# Altium schematic symbol library jlcpcb_2025_04_inductors_extended_0402.schlib: 1396 symbols (part 1 of 8)
Pins are listed as number, name and electrical type; pins without a type are passive.

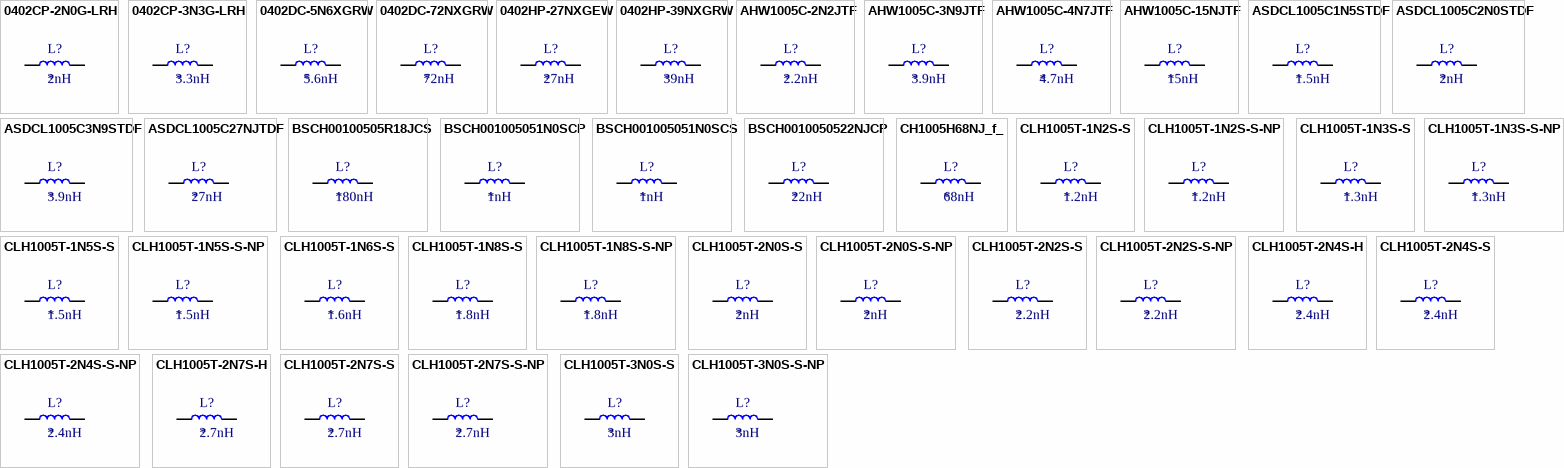
[diagram p0: symbols 0402CP-2N0G-LRH to CLH1005T-3N0S-S-NP]

## 0402CP-2N0G-LRH
designator L?  Inductance: 2nH
Inductor, 2nH, ±2%, 70mΩ, 1.04A, SMD 0402; Manufacturer: PSA(Prosperity Dielectrics); Manufacturer Part Number: 0402CP-2N0G-LRH; Package Size: 0402; JLCPCB Basic Part: No; JLCPCB Part Number: C346262; Supplier 1: LCSC; Category: Inductors; Supplier Part Number 1: C346262; Tolerance: ±2%; Rated Current: 1.04A; DC Resistance: 70mΩ; RoHS: Yes; ComponentLink1Description: Datasheet; ComponentLink1URL: https://wmsc.lcsc.com/wmsc/upload/file/pdf/v2/lcsc/2304140030_PSA-Prosperity-Dielectrics-0402CP-2N0G-LRH_C346262.pdf; ComponentLink2Description: JLCPCB Part URL; ComponentLink2URL: https://jlcpcb.com/partdetail/C346262; ComponentLink3Description: LCSC Part URL; ComponentLink3URL: https://lcsc.com/product-detail/Inductors-SMD_PSAProsperity-Dielectrics-PSAProsperity-Dielectrics-0402CP-2N0G-LRH_C346262.html
footprint IND-0402 (0402 (1005M) Inductor)
pins: 1, 2

## 0402CP-3N3G-LRH
designator L?  Inductance: 3.3nH
Inductor, 3.3nH, ±2%, 66mΩ, 840mA, SMD 0402; Manufacturer: PSA(Prosperity Dielectrics); Manufacturer Part Number: 0402CP-3N3G-LRH; Package Size: 0402; JLCPCB Basic Part: No; JLCPCB Part Number: C346270; Supplier 1: LCSC; Category: Inductors; Supplier Part Number 1: C346270; Tolerance: ±2%; Rated Current: 840mA; DC Resistance: 66mΩ; RoHS: Yes; ComponentLink1Description: Datasheet; ComponentLink1URL: https://wmsc.lcsc.com/wmsc/upload/file/pdf/v2/lcsc/1912111437_PSA-Prosperity-Dielectrics-0402CP-3N3G-LRH_C346270.pdf; ComponentLink2Description: JLCPCB Part URL; ComponentLink2URL: https://jlcpcb.com/partdetail/C346270; ComponentLink3Description: LCSC Part URL; ComponentLink3URL: https://lcsc.com/product-detail/Inductors-SMD_PSAProsperity-Dielectrics-PSAProsperity-Dielectrics-0402CP-3N3G-LRH_C346270.html
footprint IND-0402 (0402 (1005M) Inductor)
pins: 1, 2

## 0402DC-5N6XGRW
designator L?  Inductance: 5.6nH
Inductor, 5.6nH, ±2%, 57mΩ, 1.5A, SMD 0402; Manufacturer: Coilcraft; Manufacturer Part Number: 0402DC-5N6XGRW; Self-Resonant Frequency: 11GHz; Q Factor: 69@900MHz; Package Size: 0402; JLCPCB Basic Part: No; JLCPCB Part Number: C335632; Supplier 1: LCSC; Category: Inductors; Supplier Part Number 1: C335632; Tolerance: ±2%; Rated Current: 1.5A; DC Resistance: 57mΩ; RoHS: Yes; ComponentLink1Description: Datasheet; ComponentLink1URL: https://wmsc.lcsc.com/wmsc/upload/file/pdf/v2/lcsc/2304140030_Coilcraft-0402DC-5N6XGRW_C335632.pdf; ComponentLink2Description: JLCPCB Part URL; ComponentLink2URL: https://jlcpcb.com/partdetail/C335632; ComponentLink3Description: LCSC Part URL; ComponentLink3URL: https://lcsc.com/product-detail/Inductors-SMD_Coilcraft-Coilcraft-0402DC-5N6XGRW_C335632.html
footprint IND-0402 (0402 (1005M) Inductor)
pins: 1, 2

## 0402DC-72NXGRW
designator L?  Inductance: 72nH
Inductor, 72nH, ±2%, 787mΩ, 440mA, SMD 0402; Manufacturer: Coilcraft; Manufacturer Part Number: 0402DC-72NXGRW; Self-Resonant Frequency: 2.83GHz; Q Factor: 54@900MHz; Package Size: 0402; JLCPCB Basic Part: No; JLCPCB Part Number: C335567; Supplier 1: LCSC; Category: Inductors; Supplier Part Number 1: C335567; Tolerance: ±2%; Rated Current: 440mA; DC Resistance: 787mΩ; RoHS: Yes; ComponentLink1Description: Datasheet; ComponentLink1URL: https://wmsc.lcsc.com/wmsc/upload/file/pdf/v2/lcsc/2304140030_Coilcraft-0402DC-72NXGRW_C335567.pdf; ComponentLink2Description: JLCPCB Part URL; ComponentLink2URL: https://jlcpcb.com/partdetail/C335567; ComponentLink3Description: LCSC Part URL; ComponentLink3URL: https://lcsc.com/product-detail/Inductors-SMD_Coilcraft-Coilcraft-0402DC-72NXGRW_C335567.html
footprint IND-0402 (0402 (1005M) Inductor)
pins: 1, 2

## 0402HP-27NXGEW
designator L?  Inductance: 27nH
Inductor, 27nH, ±2%, 350mΩ, 450mA, SMD 0402; Manufacturer: Coilcraft; Manufacturer Part Number: 0402HP-27NXGEW; Self-Resonant Frequency: 3.2GHz; Q Factor: 62@900MHz; Package Size: 0402; JLCPCB Basic Part: No; JLCPCB Part Number: C335556; Supplier 1: LCSC; Category: Inductors; Supplier Part Number 1: C335556; Tolerance: ±2%; Rated Current: 450mA; DC Resistance: 350mΩ; RoHS: Yes; ComponentLink1Description: Datasheet; ComponentLink1URL: https://wmsc.lcsc.com/wmsc/upload/file/pdf/v2/lcsc/1912111437_Coilcraft-0402HP-27NXGEW_C335556.pdf; ComponentLink2Description: JLCPCB Part URL; ComponentLink2URL: https://jlcpcb.com/partdetail/C335556; ComponentLink3Description: LCSC Part URL; ComponentLink3URL: https://lcsc.com/product-detail/Inductors-SMD_Coilcraft-Coilcraft-0402HP-27NXGEW_C335556.html
footprint IND-0402 (0402 (1005M) Inductor)
pins: 1, 2

## 0402HP-39NXGRW
designator L?  Inductance: 39nH
Inductor, 39nH, SMD 0402; Manufacturer: Coilcraft; Manufacturer Part Number: 0402HP-39NXGRW; Package Size: 0402; JLCPCB Basic Part: No; JLCPCB Part Number: C335561; Supplier 1: LCSC; Category: Inductors; Supplier Part Number 1: C335561; RoHS: Yes; ComponentLink1Description: Datasheet; ComponentLink2Description: JLCPCB Part URL; ComponentLink2URL: https://jlcpcb.com/partdetail/C335561; ComponentLink3Description: LCSC Part URL; ComponentLink3URL: https://lcsc.com/product-detail/Inductors-SMD_Coilcraft-Coilcraft-0402HP-39NXGRW_C335561.html
footprint IND-0402 (0402 (1005M) Inductor)
pins: 1, 2

## AHW1005C-2N2JTF
designator L?  Inductance: 2.2nH
Inductor, 2.2nH, ±5%, 90mΩ, 960mA, SMD 0402; Manufacturer: APV; Manufacturer Part Number: AHW1005C-2N2JTF; Self-Resonant Frequency: 10.8GHz; Q Factor: 21; Package Size: 0402; JLCPCB Basic Part: No; JLCPCB Part Number: C7497025; Supplier 1: LCSC; Category: Inductors; Supplier Part Number 1: C7497025; Tolerance: ±5%; Rated Current: 960mA; DC Resistance: 90mΩ; RoHS: Yes; ComponentLink1Description: Datasheet; ComponentLink1URL: https://wmsc.lcsc.com/wmsc/upload/file/pdf/v2/lcsc/2308011557_APV-AHW1005C-2N2JTF_C7497025.pdf; ComponentLink2Description: JLCPCB Part URL; ComponentLink2URL: https://jlcpcb.com/partdetail/C7497025; ComponentLink3Description: LCSC Part URL; ComponentLink3URL: https://lcsc.com/product-detail/Inductors-SMD_APV-APV-AHW1005C-2N2JTF_C7497025.html
footprint IND-0402 (0402 (1005M) Inductor)
pins: 1, 2

## AHW1005C-3N9JTF
designator L?  Inductance: 3.9nH
Inductor, 3.9nH, ±5%, 76mΩ, 840mA, SMD 0402; Manufacturer: APV; Manufacturer Part Number: AHW1005C-3N9JTF; Self-Resonant Frequency: 6GHz; Q Factor: 24; Package Size: 0402; JLCPCB Basic Part: No; JLCPCB Part Number: C6807988; Supplier 1: LCSC; Category: Inductors; Supplier Part Number 1: C6807988; Tolerance: ±5%; Rated Current: 840mA; DC Resistance: 76mΩ; RoHS: Yes; ComponentLink1Description: Datasheet; ComponentLink1URL: https://wmsc.lcsc.com/wmsc/upload/file/pdf/v2/lcsc/2306211548_APV-AHW1005C-3N9JTF_C6807988.pdf; ComponentLink2Description: JLCPCB Part URL; ComponentLink2URL: https://jlcpcb.com/partdetail/C6807988; ComponentLink3Description: LCSC Part URL; ComponentLink3URL: https://lcsc.com/product-detail/Inductors-SMD_APV-APV-AHW1005C-3N9JTF_C6807988.html
footprint IND-0402 (0402 (1005M) Inductor)
pins: 1, 2

## AHW1005C-4N7JTF
designator L?  Inductance: 4.7nH
Inductor, 4.7nH, ±5%, 130mΩ, 640mA, SMD 0402; Manufacturer: APV; Manufacturer Part Number: AHW1005C-4N7JTF; Self-Resonant Frequency: 4.77GHz; Q Factor: 20; Package Size: 0402; JLCPCB Basic Part: No; JLCPCB Part Number: C7427063; Supplier 1: LCSC; Category: Inductors; Supplier Part Number 1: C7427063; Tolerance: ±5%; Rated Current: 640mA; DC Resistance: 130mΩ; RoHS: Yes; ComponentLink1Description: Datasheet; ComponentLink1URL: https://wmsc.lcsc.com/wmsc/upload/file/pdf/v2/lcsc/2306141056_APV-AHW1005C-4N7JTF_C7427063.pdf; ComponentLink2Description: JLCPCB Part URL; ComponentLink2URL: https://jlcpcb.com/partdetail/C7427063; ComponentLink3Description: LCSC Part URL; ComponentLink3URL: https://lcsc.com/product-detail/Inductors-SMD_APV-APV-AHW1005C-4N7JTF_C7427063.html
footprint IND-0402 (0402 (1005M) Inductor)
pins: 1, 2

## AHW1005C-15NJTF
designator L?  Inductance: 15nH
Inductor, 15nH, ±5%, 170mΩ, 560mA, SMD 0402; Manufacturer: APV; Manufacturer Part Number: AHW1005C-15NJTF; Self-Resonant Frequency: 3.28GHz; Q Factor: 26; Package Size: 0402; JLCPCB Basic Part: No; JLCPCB Part Number: C6364689; Supplier 1: LCSC; Category: Inductors; Supplier Part Number 1: C6364689; Tolerance: ±5%; Rated Current: 560mA; DC Resistance: 170mΩ; RoHS: Yes; ComponentLink1Description: Datasheet; ComponentLink1URL: https://wmsc.lcsc.com/wmsc/upload/file/pdf/v2/lcsc/2305231104_APV-AHW1005C-15NJTF_C6364689.pdf; ComponentLink2Description: JLCPCB Part URL; ComponentLink2URL: https://jlcpcb.com/partdetail/C6364689; ComponentLink3Description: LCSC Part URL; ComponentLink3URL: https://lcsc.com/product-detail/Inductors-SMD_APV-APV-AHW1005C-15NJTF_C6364689.html
footprint IND-0402 (0402 (1005M) Inductor)
pins: 1, 2

## ASDCL1005C1N5STDF
designator L?  Inductance: 1.5nH
Inductor, 1.5nH, 100mΩ, 300mA, SMD 0402; Manufacturer: Sunlord; Manufacturer Part Number: ASDCL1005C1N5STDF; Self-Resonant Frequency: 6GHz; Package Size: 0402; JLCPCB Basic Part: No; JLCPCB Part Number: C2846441; Supplier 1: LCSC; Category: Inductors; Supplier Part Number 1: C2846441; Rated Current: 300mA; DC Resistance: 100mΩ; RoHS: Yes; ComponentLink1Description: Datasheet; ComponentLink1URL: https://wmsc.lcsc.com/wmsc/upload/file/pdf/v2/lcsc/2310301640_Sunlord-ASDCL1005C1N5STDF_C2846441.pdf; ComponentLink2Description: JLCPCB Part URL; ComponentLink2URL: https://jlcpcb.com/partdetail/C2846441; ComponentLink3Description: LCSC Part URL; ComponentLink3URL: https://lcsc.com/product-detail/Inductors-SMD_Sunlord-Sunlord-ASDCL1005C1N5STDF_C2846441.html
footprint IND-0402 (0402 (1005M) Inductor)
pins: 1, 2

## ASDCL1005C2N0STDF
designator L?  Inductance: 2nH
Inductor, 2nH, 300mA, SMD 0402; Manufacturer: Sunlord; Manufacturer Part Number: ASDCL1005C2N0STDF; Package Size: 0402; JLCPCB Basic Part: No; JLCPCB Part Number: C2846444; Supplier 1: LCSC; Category: Inductors; Supplier Part Number 1: C2846444; Rated Current: 300mA; RoHS: Yes; ComponentLink1Description: Datasheet; ComponentLink1URL: https://wmsc.lcsc.com/wmsc/upload/file/pdf/v2/lcsc/2310301640_Sunlord-ASDCL1005C2N0STDF_C2846444.pdf; ComponentLink2Description: JLCPCB Part URL; ComponentLink2URL: https://jlcpcb.com/partdetail/C2846444; ComponentLink3Description: LCSC Part URL; ComponentLink3URL: https://lcsc.com/product-detail/Inductors-SMD_Sunlord-Sunlord-ASDCL1005C2N0STDF_C2846444.html
footprint IND-0402 (0402 (1005M) Inductor)
pins: 1, 2

## ASDCL1005C3N9STDF
designator L?  Inductance: 3.9nH
Inductor, 3.9nH, 200mΩ, 300mA, SMD 0402; Manufacturer: Sunlord; Manufacturer Part Number: ASDCL1005C3N9STDF; Self-Resonant Frequency: 4GHz; Q Factor: 8@100MHz; Package Size: 0402; JLCPCB Basic Part: No; JLCPCB Part Number: C2846451; Supplier 1: LCSC; Category: Inductors; Supplier Part Number 1: C2846451; Rated Current: 300mA; DC Resistance: 200mΩ; RoHS: Yes; ComponentLink1Description: Datasheet; ComponentLink1URL: https://wmsc.lcsc.com/wmsc/upload/file/pdf/v2/lcsc/2310301640_Sunlord-ASDCL1005C3N9STDF_C2846451.pdf; ComponentLink2Description: JLCPCB Part URL; ComponentLink2URL: https://jlcpcb.com/partdetail/C2846451; ComponentLink3Description: LCSC Part URL; ComponentLink3URL: https://lcsc.com/product-detail/Inductors-SMD_Sunlord-Sunlord-ASDCL1005C3N9STDF_C2846451.html
footprint IND-0402 (0402 (1005M) Inductor)
pins: 1, 2

## ASDCL1005C27NJTDF
designator L?  Inductance: 27nH
Inductor, 27nH, ±5%, 0.7Ω, 300mA, SMD 0402; Manufacturer: Sunlord; Manufacturer Part Number: ASDCL1005C27NJTDF; Self-Resonant Frequency: 1.6GHz; Q Factor: 8@100MHz; Package Size: 0402; JLCPCB Basic Part: No; JLCPCB Part Number: C2846467; Supplier 1: LCSC; Category: Inductors; Supplier Part Number 1: C2846467; Tolerance: ±5%; Rated Current: 300mA; DC Resistance: 0.7Ω; RoHS: Yes; ComponentLink1Description: Datasheet; ComponentLink1URL: https://wmsc.lcsc.com/wmsc/upload/file/pdf/v2/lcsc/2310301640_Sunlord-ASDCL1005C27NJTDF_C2846467.pdf; ComponentLink2Description: JLCPCB Part URL; ComponentLink2URL: https://jlcpcb.com/partdetail/C2846467; ComponentLink3Description: LCSC Part URL; ComponentLink3URL: https://lcsc.com/product-detail/Inductors-SMD_Sunlord-Sunlord-ASDCL1005C27NJTDF_C2846467.html
footprint IND-0402 (0402 (1005M) Inductor)
pins: 1, 2

## BSCH00100505R18JCS
designator L?  Inductance: 180nH
Inductor, 180nH, ±5%, SMD 0402; Manufacturer: Chilisin Elec; Manufacturer Part Number: BSCH00100505R18JCS; Package Size: 0402; JLCPCB Basic Part: No; JLCPCB Part Number: C2981210; Supplier 1: LCSC; Category: Inductors; Supplier Part Number 1: C2981210; Tolerance: ±5%; RoHS: Yes; ComponentLink1Description: Datasheet; ComponentLink1URL: https://wmsc.lcsc.com/wmsc/upload/file/pdf/v2/lcsc/2204251600_Chilisin-Elec-BSCH00100505R18JCS_C2981210.pdf; ComponentLink2Description: JLCPCB Part URL; ComponentLink2URL: https://jlcpcb.com/partdetail/C2981210; ComponentLink3Description: LCSC Part URL; ComponentLink3URL: https://lcsc.com/product-detail/Power-Inductors_Chilisin-Elec-Chilisin-Elec-BSCH00100505R18JCS_C2981210.html
footprint IND-0402 (0402 (1005M) Inductor)
pins: 1, 2

## BSCH001005051N0SCP
designator L?  Inductance: 1nH
Inductor, 1nH, 70mΩ, 400mA, SMD 0402; Manufacturer: Chilisin Elec; Manufacturer Part Number: BSCH001005051N0SCP; Package Size: 0402; JLCPCB Basic Part: No; JLCPCB Part Number: C3910754; Supplier 1: LCSC; Category: Inductors; Supplier Part Number 1: C3910754; Rated Current: 400mA; DC Resistance: 70mΩ; RoHS: Yes; ComponentLink1Description: Datasheet; ComponentLink1URL: https://wmsc.lcsc.com/wmsc/upload/file/pdf/v2/lcsc/2404081008_Chilisin-Elec-BSCH001005051N0SCP_C3910754.pdf; ComponentLink2Description: JLCPCB Part URL; ComponentLink2URL: https://jlcpcb.com/partdetail/C3910754; ComponentLink3Description: LCSC Part URL; ComponentLink3URL: https://lcsc.com/product-detail/Power-Inductors_Chilisin-Elec-Chilisin-Elec-BSCH001005051N0SCP_C3910754.html
footprint IND-0402 (0402 (1005M) Inductor)
pins: 1, 2

## BSCH001005051N0SCS
designator L?  Inductance: 1nH
Inductor, 1nH, 70mΩ, 400mA, SMD 0402; Manufacturer: Chilisin Elec; Manufacturer Part Number: BSCH001005051N0SCS; Q Factor: 8@100MHz; Package Size: 0402; JLCPCB Basic Part: No; JLCPCB Part Number: C2935072; Supplier 1: LCSC; Category: Inductors; Supplier Part Number 1: C2935072; Rated Current: 400mA; DC Resistance: 70mΩ; RoHS: Yes; ComponentLink1Description: Datasheet; ComponentLink1URL: https://wmsc.lcsc.com/wmsc/upload/file/pdf/v2/lcsc/2201121700_Chilisin-Elec-BSCH001005051N0SCS_C2935072.pdf; ComponentLink2Description: JLCPCB Part URL; ComponentLink2URL: https://jlcpcb.com/partdetail/C2935072; ComponentLink3Description: LCSC Part URL; ComponentLink3URL: https://lcsc.com/product-detail/Inductors-SMD_Chilisin-Elec-Chilisin-Elec-BSCH001005051N0SCS_C2935072.html
footprint IND-0402 (0402 (1005M) Inductor)
pins: 1, 2

## BSCH0010050522NJCP
designator L?  Inductance: 22nH
Inductor, 22nH, ±5%, SMD 0402; Manufacturer: Chilisin Elec; Manufacturer Part Number: BSCH0010050522NJCP; Package Size: 0402; JLCPCB Basic Part: No; JLCPCB Part Number: C2935073; Supplier 1: LCSC; Category: Inductors; Supplier Part Number 1: C2935073; Tolerance: ±5%; RoHS: Yes; ComponentLink1Description: Datasheet; ComponentLink1URL: https://wmsc.lcsc.com/wmsc/upload/file/pdf/v2/lcsc/2204151745_Chilisin-Elec-BSCH0010050522NJCP_C2935073.pdf; ComponentLink2Description: JLCPCB Part URL; ComponentLink2URL: https://jlcpcb.com/partdetail/C2935073; ComponentLink3Description: LCSC Part URL; ComponentLink3URL: https://lcsc.com/product-detail/Power-Inductors_Chilisin-Elec-Chilisin-Elec-BSCH0010050522NJCP_C2935073.html
footprint IND-0402 (0402 (1005M) Inductor)
pins: 1, 2

## CH1005H68NJ_f_
designator L?  Inductance: 68nH
Inductor, 68nH, ±5%, 2.1Ω, 150mA, SMD 0402; Manufacturer: CEC(Shenzhen Zhenhua Fu Elec); Manufacturer Part Number: CH1005H68NJ(f); Self-Resonant Frequency: 800MHz; Q Factor: 8@100MHz; Package Size: 0402; JLCPCB Basic Part: No; JLCPCB Part Number: C316325; Supplier 1: LCSC; Category: Inductors; Supplier Part Number 1: C316325; Tolerance: ±5%; Rated Current: 150mA; DC Resistance: 2.1Ω; RoHS: Yes; ComponentLink1Description: Datasheet; ComponentLink1URL: https://wmsc.lcsc.com/wmsc/upload/file/pdf/v2/lcsc/2304140030_CEC-Shenzhen-Zhenhua-Fu-Elec-CH1005H68NJ-f_C316325.pdf; ComponentLink2Description: JLCPCB Part URL; ComponentLink2URL: https://jlcpcb.com/partdetail/C316325; ComponentLink3Description: LCSC Part URL; ComponentLink3URL: https://lcsc.com/product-detail/Inductors-SMD_CECShenzhen-Zhenhua-Fu-Elec-CECShenzhen-Zhenhua-Fu-Elec-CH1005H68NJf_C316325.html
footprint IND-0402 (0402 (1005M) Inductor)
pins: 1, 2

## CLH1005T-1N2S-S
designator L?  Inductance: 1.2nH
Inductor, 1.2nH, 90mΩ, 400mA, SMD 0402; Manufacturer: Chilisin Elec; Manufacturer Part Number: CLH1005T-1N2S-S; Self-Resonant Frequency: 10GHz; Q Factor: 8@100MHz; Package Size: 0402; JLCPCB Basic Part: No; JLCPCB Part Number: C108251; Supplier 1: LCSC; Category: Inductors; Supplier Part Number 1: C108251; Rated Current: 400mA; DC Resistance: 90mΩ; RoHS: Yes; ComponentLink1Description: Datasheet; ComponentLink1URL: https://wmsc.lcsc.com/wmsc/upload/file/pdf/v2/lcsc/2304140030_Chilisin-Elec-CLH1005T-1N2S-S_C108251.pdf; ComponentLink2Description: JLCPCB Part URL; ComponentLink2URL: https://jlcpcb.com/partdetail/C108251; ComponentLink3Description: LCSC Part URL; ComponentLink3URL: https://lcsc.com/product-detail/Inductors-SMD_Chilisin-Elec-Chilisin-Elec-CLH1005T-1N2S-S_C108251.html
footprint IND-0402 (0402 (1005M) Inductor)
pins: 1, 2

## CLH1005T-1N2S-S-NP
designator L?  Inductance: 1.2nH
Inductor, 1.2nH, 90mΩ, 400mA, SMD 0402; Manufacturer: Chilisin Elec; Manufacturer Part Number: CLH1005T-1N2S-S-NP; Self-Resonant Frequency: 10GHz; Q Factor: 8@100MHz; Package Size: 0402; JLCPCB Basic Part: No; JLCPCB Part Number: C142247; Supplier 1: LCSC; Category: Inductors; Supplier Part Number 1: C142247; Rated Current: 400mA; DC Resistance: 90mΩ; RoHS: Yes; ComponentLink1Description: Datasheet; ComponentLink1URL: https://wmsc.lcsc.com/wmsc/upload/file/pdf/v2/lcsc/2304140030_Chilisin-Elec-CLH1005T-1N2S-S-NP_C142247.pdf; ComponentLink2Description: JLCPCB Part URL; ComponentLink2URL: https://jlcpcb.com/partdetail/C142247; ComponentLink3Description: LCSC Part URL; ComponentLink3URL: https://lcsc.com/product-detail/Inductors-SMD_Chilisin-Elec-Chilisin-Elec-CLH1005T-1N2S-S-NP_C142247.html
footprint IND-0402 (0402 (1005M) Inductor)
pins: 1, 2

## CLH1005T-1N3S-S
designator L?  Inductance: 1.3nH
Inductor, 1.3nH, 100mΩ, 400mA, SMD 0402; Manufacturer: Chilisin Elec; Manufacturer Part Number: CLH1005T-1N3S-S; Self-Resonant Frequency: 9GHz; Q Factor: 8@100MHz; Package Size: 0402; JLCPCB Basic Part: No; JLCPCB Part Number: C365894; Supplier 1: LCSC; Category: Inductors; Supplier Part Number 1: C365894; Rated Current: 400mA; DC Resistance: 100mΩ; RoHS: Yes; ComponentLink1Description: Datasheet; ComponentLink1URL: https://wmsc.lcsc.com/wmsc/upload/file/pdf/v2/lcsc/2304140030_Chilisin-Elec-CLH1005T-1N3S-S_C365894.pdf; ComponentLink2Description: JLCPCB Part URL; ComponentLink2URL: https://jlcpcb.com/partdetail/C365894; ComponentLink3Description: LCSC Part URL; ComponentLink3URL: https://lcsc.com/product-detail/Inductors-SMD_Chilisin-Elec-Chilisin-Elec-CLH1005T-1N3S-S_C365894.html
footprint IND-0402 (0402 (1005M) Inductor)
pins: 1, 2

## CLH1005T-1N3S-S-NP
designator L?  Inductance: 1.3nH
Inductor, 1.3nH, 100mΩ, 400mA, SMD 0402; Manufacturer: Chilisin Elec; Manufacturer Part Number: CLH1005T-1N3S-S-NP; Self-Resonant Frequency: 6GHz; Q Factor: 8@100MHz; Package Size: 0402; JLCPCB Basic Part: No; JLCPCB Part Number: C280670; Supplier 1: LCSC; Category: Inductors; Supplier Part Number 1: C280670; Rated Current: 400mA; DC Resistance: 100mΩ; RoHS: Yes; ComponentLink1Description: Datasheet; ComponentLink1URL: https://wmsc.lcsc.com/wmsc/upload/file/pdf/v2/lcsc/2304140030_Chilisin-Elec-CLH1005T-1N3S-S-NP_C280670.pdf; ComponentLink2Description: JLCPCB Part URL; ComponentLink2URL: https://jlcpcb.com/partdetail/C280670; ComponentLink3Description: LCSC Part URL; ComponentLink3URL: https://lcsc.com/product-detail/Inductors-SMD_Chilisin-Elec-Chilisin-Elec-CLH1005T-1N3S-S-NP_C280670.html
footprint IND-0402 (0402 (1005M) Inductor)
pins: 1, 2

## CLH1005T-1N5S-S
designator L?  Inductance: 1.5nH
Inductor, 1.5nH, 100mΩ, 400mA, SMD 0402; Manufacturer: Chilisin Elec; Manufacturer Part Number: CLH1005T-1N5S-S; Self-Resonant Frequency: 9GHz; Q Factor: 8@100MHz; Package Size: 0402; JLCPCB Basic Part: No; JLCPCB Part Number: C108252; Supplier 1: LCSC; Category: Inductors; Supplier Part Number 1: C108252; Rated Current: 400mA; DC Resistance: 100mΩ; RoHS: Yes; ComponentLink1Description: Datasheet; ComponentLink1URL: https://wmsc.lcsc.com/wmsc/upload/file/pdf/v2/lcsc/2304140030_Chilisin-Elec-CLH1005T-1N5S-S_C108252.pdf; ComponentLink2Description: JLCPCB Part URL; ComponentLink2URL: https://jlcpcb.com/partdetail/C108252; ComponentLink3Description: LCSC Part URL; ComponentLink3URL: https://lcsc.com/product-detail/Inductors-SMD_Chilisin-Elec-Chilisin-Elec-CLH1005T-1N5S-S_C108252.html
footprint IND-0402 (0402 (1005M) Inductor)
pins: 1, 2

## CLH1005T-1N5S-S-NP
designator L?  Inductance: 1.5nH
Inductor, 1.5nH, 100mΩ, 400mA, SMD 0402; Manufacturer: Chilisin Elec; Manufacturer Part Number: CLH1005T-1N5S-S-NP; Self-Resonant Frequency: 9GHz; Q Factor: 8@100MHz; Package Size: 0402; JLCPCB Basic Part: No; JLCPCB Part Number: C142246; Supplier 1: LCSC; Category: Inductors; Supplier Part Number 1: C142246; Rated Current: 400mA; DC Resistance: 100mΩ; RoHS: Yes; ComponentLink1Description: Datasheet; ComponentLink1URL: https://wmsc.lcsc.com/wmsc/upload/file/pdf/v2/lcsc/2304140030_Chilisin-Elec-CLH1005T-1N5S-S-NP_C142246.pdf; ComponentLink2Description: JLCPCB Part URL; ComponentLink2URL: https://jlcpcb.com/partdetail/C142246; ComponentLink3Description: LCSC Part URL; ComponentLink3URL: https://lcsc.com/product-detail/Inductors-SMD_Chilisin-Elec-Chilisin-Elec-CLH1005T-1N5S-S-NP_C142246.html
footprint IND-0402 (0402 (1005M) Inductor)
pins: 1, 2

## CLH1005T-1N6S-S
designator L?  Inductance: 1.6nH
Inductor, 1.6nH, 100mΩ, 400mA, SMD 0402; Manufacturer: Chilisin Elec; Manufacturer Part Number: CLH1005T-1N6S-S; Self-Resonant Frequency: 8.7GHz; Q Factor: 8@100MHz; Package Size: 0402; JLCPCB Basic Part: No; JLCPCB Part Number: C365895; Supplier 1: LCSC; Category: Inductors; Supplier Part Number 1: C365895; Rated Current: 400mA; DC Resistance: 100mΩ; RoHS: Yes; ComponentLink1Description: Datasheet; ComponentLink1URL: https://wmsc.lcsc.com/wmsc/upload/file/pdf/v2/lcsc/2304140030_Chilisin-Elec-CLH1005T-1N6S-S_C365895.pdf; ComponentLink2Description: JLCPCB Part URL; ComponentLink2URL: https://jlcpcb.com/partdetail/C365895; ComponentLink3Description: LCSC Part URL; ComponentLink3URL: https://lcsc.com/product-detail/Inductors-SMD_Chilisin-Elec-Chilisin-Elec-CLH1005T-1N6S-S_C365895.html
footprint IND-0402 (0402 (1005M) Inductor)
pins: 1, 2

## CLH1005T-1N8S-S
designator L?  Inductance: 1.8nH
Inductor, 1.8nH, 100mΩ, 400mA, SMD 0402; Manufacturer: Chilisin Elec; Manufacturer Part Number: CLH1005T-1N8S-S; Self-Resonant Frequency: 8.7GHz; Q Factor: 8@100MHz; Package Size: 0402; JLCPCB Basic Part: No; JLCPCB Part Number: C142245; Supplier 1: LCSC; Category: Inductors; Supplier Part Number 1: C142245; Rated Current: 400mA; DC Resistance: 100mΩ; RoHS: Yes; ComponentLink1Description: Datasheet; ComponentLink1URL: https://wmsc.lcsc.com/wmsc/upload/file/pdf/v2/lcsc/2304140030_Chilisin-Elec-CLH1005T-1N8S-S_C142245.pdf; ComponentLink2Description: JLCPCB Part URL; ComponentLink2URL: https://jlcpcb.com/partdetail/C142245; ComponentLink3Description: LCSC Part URL; ComponentLink3URL: https://lcsc.com/product-detail/Inductors-SMD_Chilisin-Elec-Chilisin-Elec-CLH1005T-1N8S-S_C142245.html
footprint IND-0402 (0402 (1005M) Inductor)
pins: 1, 2

## CLH1005T-1N8S-S-NP
designator L?  Inductance: 1.8nH
Inductor, 1.8nH, 100mΩ, 400mA, SMD 0402; Manufacturer: Chilisin Elec; Manufacturer Part Number: CLH1005T-1N8S-S-NP; Self-Resonant Frequency: 8.7GHz; Q Factor: 8@100MHz; Package Size: 0402; JLCPCB Basic Part: No; JLCPCB Part Number: C142244; Supplier 1: LCSC; Category: Inductors; Supplier Part Number 1: C142244; Rated Current: 400mA; DC Resistance: 100mΩ; RoHS: Yes; ComponentLink1Description: Datasheet; ComponentLink1URL: https://wmsc.lcsc.com/wmsc/upload/file/pdf/v2/lcsc/2304140030_Chilisin-Elec-CLH1005T-1N8S-S-NP_C142244.pdf; ComponentLink2Description: JLCPCB Part URL; ComponentLink2URL: https://jlcpcb.com/partdetail/C142244; ComponentLink3Description: LCSC Part URL; ComponentLink3URL: https://lcsc.com/product-detail/Inductors-SMD_Chilisin-Elec-Chilisin-Elec-CLH1005T-1N8S-S-NP_C142244.html
footprint IND-0402 (0402 (1005M) Inductor)
pins: 1, 2

## CLH1005T-2N0S-S
designator L?  Inductance: 2nH
Inductor, 2nH, 100mΩ, 400mA, SMD 0402; Manufacturer: Chilisin Elec; Manufacturer Part Number: CLH1005T-2N0S-S; Self-Resonant Frequency: 8.1GHz; Q Factor: 8@100MHz; Package Size: 0402; JLCPCB Basic Part: No; JLCPCB Part Number: C142240; Supplier 1: LCSC; Category: Inductors; Supplier Part Number 1: C142240; Rated Current: 400mA; DC Resistance: 100mΩ; RoHS: Yes; ComponentLink1Description: Datasheet; ComponentLink1URL: https://wmsc.lcsc.com/wmsc/upload/file/pdf/v2/lcsc/2304140030_Chilisin-Elec-CLH1005T-2N0S-S_C142240.pdf; ComponentLink2Description: JLCPCB Part URL; ComponentLink2URL: https://jlcpcb.com/partdetail/C142240; ComponentLink3Description: LCSC Part URL; ComponentLink3URL: https://lcsc.com/product-detail/Inductors-SMD_Chilisin-Elec-Chilisin-Elec-CLH1005T-2N0S-S_C142240.html
footprint IND-0402 (0402 (1005M) Inductor)
pins: 1, 2

## CLH1005T-2N0S-S-NP
designator L?  Inductance: 2nH
Inductor, 2nH, 100mΩ, 400mA, SMD 0402; Manufacturer: Chilisin Elec; Manufacturer Part Number: CLH1005T-2N0S-S-NP; Self-Resonant Frequency: 8.1GHz; Q Factor: 8@100MHz; Package Size: 0402; JLCPCB Basic Part: No; JLCPCB Part Number: C142239; Supplier 1: LCSC; Category: Inductors; Supplier Part Number 1: C142239; Rated Current: 400mA; DC Resistance: 100mΩ; RoHS: Yes; ComponentLink1Description: Datasheet; ComponentLink1URL: https://wmsc.lcsc.com/wmsc/upload/file/pdf/v2/lcsc/2304140030_Chilisin-Elec-CLH1005T-2N0S-S-NP_C142239.pdf; ComponentLink2Description: JLCPCB Part URL; ComponentLink2URL: https://jlcpcb.com/partdetail/C142239; ComponentLink3Description: LCSC Part URL; ComponentLink3URL: https://lcsc.com/product-detail/Inductors-SMD_Chilisin-Elec-Chilisin-Elec-CLH1005T-2N0S-S-NP_C142239.html
footprint IND-0402 (0402 (1005M) Inductor)
pins: 1, 2

## CLH1005T-2N2S-S
designator L?  Inductance: 2.2nH
Inductor, 2.2nH, 120mΩ, 400mA, SMD 0402; Manufacturer: Chilisin Elec; Manufacturer Part Number: CLH1005T-2N2S-S; Self-Resonant Frequency: 8.1GHz; Q Factor: 8@100MHz; Package Size: 0402; JLCPCB Basic Part: No; JLCPCB Part Number: C108254; Supplier 1: LCSC; Category: Inductors; Supplier Part Number 1: C108254; Rated Current: 400mA; DC Resistance: 120mΩ; RoHS: Yes; ComponentLink1Description: Datasheet; ComponentLink1URL: https://wmsc.lcsc.com/wmsc/upload/file/pdf/v2/lcsc/2304140030_Chilisin-Elec-CLH1005T-2N2S-S_C108254.pdf; ComponentLink2Description: JLCPCB Part URL; ComponentLink2URL: https://jlcpcb.com/partdetail/C108254; ComponentLink3Description: LCSC Part URL; ComponentLink3URL: https://lcsc.com/product-detail/Inductors-SMD_Chilisin-Elec-Chilisin-Elec-CLH1005T-2N2S-S_C108254.html
footprint IND-0402 (0402 (1005M) Inductor)
pins: 1, 2

## CLH1005T-2N2S-S-NP
designator L?  Inductance: 2.2nH
Inductor, 2.2nH, 120mΩ, 400mA, SMD 0402; Manufacturer: Chilisin Elec; Manufacturer Part Number: CLH1005T-2N2S-S-NP; Self-Resonant Frequency: 8.1GHz; Q Factor: 8@100MHz; Package Size: 0402; JLCPCB Basic Part: No; JLCPCB Part Number: C142238; Supplier 1: LCSC; Category: Inductors; Supplier Part Number 1: C142238; Rated Current: 400mA; DC Resistance: 120mΩ; RoHS: Yes; ComponentLink1Description: Datasheet; ComponentLink1URL: https://wmsc.lcsc.com/wmsc/upload/file/pdf/v2/lcsc/2304140030_Chilisin-Elec-CLH1005T-2N2S-S-NP_C142238.pdf; ComponentLink2Description: JLCPCB Part URL; ComponentLink2URL: https://jlcpcb.com/partdetail/C142238; ComponentLink3Description: LCSC Part URL; ComponentLink3URL: https://lcsc.com/product-detail/Inductors-SMD_Chilisin-Elec-Chilisin-Elec-CLH1005T-2N2S-S-NP_C142238.html
footprint IND-0402 (0402 (1005M) Inductor)
pins: 1, 2

## CLH1005T-2N4S-H
designator L?  Inductance: 2.4nH
Inductor, 2.4nH, SMD 0402; Manufacturer: Chilisin Elec; Manufacturer Part Number: CLH1005T-2N4S-H; Package Size: 0402; JLCPCB Basic Part: No; JLCPCB Part Number: C329630; Supplier 1: LCSC; Category: Inductors; Supplier Part Number 1: C329630; RoHS: Yes; ComponentLink1Description: Datasheet; ComponentLink1URL: https://wmsc.lcsc.com/wmsc/upload/file/pdf/v2/lcsc/1912111437_Chilisin-Elec-CLH1005T-2N4S-H_C329630.pdf; ComponentLink2Description: JLCPCB Part URL; ComponentLink2URL: https://jlcpcb.com/partdetail/C329630; ComponentLink3Description: LCSC Part URL; ComponentLink3URL: https://lcsc.com/product-detail/Inductors-SMD_Chilisin-Elec-Chilisin-Elec-CLH1005T-2N4S-H_C329630.html
footprint IND-0402 (0402 (1005M) Inductor)
pins: 1, 2

## CLH1005T-2N4S-S
designator L?  Inductance: 2.4nH
Inductor, 2.4nH, 150mΩ, 400mA, SMD 0402; Manufacturer: Chilisin Elec; Manufacturer Part Number: CLH1005T-2N4S-S; Self-Resonant Frequency: 7.7GHz; Q Factor: 8@100MHz; Package Size: 0402; JLCPCB Basic Part: No; JLCPCB Part Number: C142237; Supplier 1: LCSC; Category: Inductors; Supplier Part Number 1: C142237; Rated Current: 400mA; DC Resistance: 150mΩ; RoHS: Yes; ComponentLink1Description: Datasheet; ComponentLink1URL: https://wmsc.lcsc.com/wmsc/upload/file/pdf/v2/lcsc/2304140030_Chilisin-Elec-CLH1005T-2N4S-S_C142237.pdf; ComponentLink2Description: JLCPCB Part URL; ComponentLink2URL: https://jlcpcb.com/partdetail/C142237; ComponentLink3Description: LCSC Part URL; ComponentLink3URL: https://lcsc.com/product-detail/Inductors-SMD_Chilisin-Elec-Chilisin-Elec-CLH1005T-2N4S-S_C142237.html
footprint IND-0402 (0402 (1005M) Inductor)
pins: 1, 2

## CLH1005T-2N4S-S-NP
designator L?  Inductance: 2.4nH
Inductor, 2.4nH, 150mΩ, 400mA, SMD 0402; Manufacturer: Chilisin Elec; Manufacturer Part Number: CLH1005T-2N4S-S-NP; Self-Resonant Frequency: 7.7GHz; Q Factor: 8@100MHz; Package Size: 0402; JLCPCB Basic Part: No; JLCPCB Part Number: C142236; Supplier 1: LCSC; Category: Inductors; Supplier Part Number 1: C142236; Rated Current: 400mA; DC Resistance: 150mΩ; RoHS: Yes; ComponentLink1Description: Datasheet; ComponentLink1URL: https://wmsc.lcsc.com/wmsc/upload/file/pdf/v2/lcsc/2304140030_Chilisin-Elec-CLH1005T-2N4S-S-NP_C142236.pdf; ComponentLink2Description: JLCPCB Part URL; ComponentLink2URL: https://jlcpcb.com/partdetail/C142236; ComponentLink3Description: LCSC Part URL; ComponentLink3URL: https://lcsc.com/product-detail/Inductors-SMD_Chilisin-Elec-Chilisin-Elec-CLH1005T-2N4S-S-NP_C142236.html
footprint IND-0402 (0402 (1005M) Inductor)
pins: 1, 2

## CLH1005T-2N7S-H
designator L?  Inductance: 2.7nH
Inductor, 2.7nH, 150mΩ, 400mA, SMD 0402; Manufacturer: Chilisin Elec; Manufacturer Part Number: CLH1005T-2N7S-H; Package Size: 0402; JLCPCB Basic Part: No; JLCPCB Part Number: C329631; Supplier 1: LCSC; Category: Inductors; Supplier Part Number 1: C329631; Rated Current: 400mA; DC Resistance: 150mΩ; RoHS: Yes; ComponentLink1Description: Datasheet; ComponentLink1URL: https://wmsc.lcsc.com/wmsc/upload/file/pdf/v2/lcsc/1912111437_Chilisin-Elec-CLH1005T-2N7S-H_C329631.pdf; ComponentLink2Description: JLCPCB Part URL; ComponentLink2URL: https://jlcpcb.com/partdetail/C329631; ComponentLink3Description: LCSC Part URL; ComponentLink3URL: https://lcsc.com/product-detail/Inductors-SMD_Chilisin-Elec-Chilisin-Elec-CLH1005T-2N7S-H_C329631.html
footprint IND-0402 (0402 (1005M) Inductor)
pins: 1, 2

## CLH1005T-2N7S-S
designator L?  Inductance: 2.7nH
Inductor, 2.7nH, 150mΩ, 400mA, SMD 0402; Manufacturer: Chilisin Elec; Manufacturer Part Number: CLH1005T-2N7S-S; Self-Resonant Frequency: 7.7GHz; Q Factor: 8@100MHz; Package Size: 0402; JLCPCB Basic Part: No; JLCPCB Part Number: C108255; Supplier 1: LCSC; Category: Inductors; Supplier Part Number 1: C108255; Rated Current: 400mA; DC Resistance: 150mΩ; RoHS: Yes; ComponentLink1Description: Datasheet; ComponentLink1URL: https://wmsc.lcsc.com/wmsc/upload/file/pdf/v2/lcsc/2304140030_Chilisin-Elec-CLH1005T-2N7S-S_C108255.pdf; ComponentLink2Description: JLCPCB Part URL; ComponentLink2URL: https://jlcpcb.com/partdetail/C108255; ComponentLink3Description: LCSC Part URL; ComponentLink3URL: https://lcsc.com/product-detail/Inductors-SMD_Chilisin-Elec-Chilisin-Elec-CLH1005T-2N7S-S_C108255.html
footprint IND-0402 (0402 (1005M) Inductor)
pins: 1, 2

## CLH1005T-2N7S-S-NP
designator L?  Inductance: 2.7nH
Inductor, 2.7nH, 150mΩ, 400mA, SMD 0402; Manufacturer: Chilisin Elec; Manufacturer Part Number: CLH1005T-2N7S-S-NP; Self-Resonant Frequency: 7.7GHz; Q Factor: 8@100MHz; Package Size: 0402; JLCPCB Basic Part: No; JLCPCB Part Number: C142235; Supplier 1: LCSC; Category: Inductors; Supplier Part Number 1: C142235; Rated Current: 400mA; DC Resistance: 150mΩ; RoHS: Yes; ComponentLink1Description: Datasheet; ComponentLink1URL: https://wmsc.lcsc.com/wmsc/upload/file/pdf/v2/lcsc/2304140030_Chilisin-Elec-CLH1005T-2N7S-S-NP_C142235.pdf; ComponentLink2Description: JLCPCB Part URL; ComponentLink2URL: https://jlcpcb.com/partdetail/C142235; ComponentLink3Description: LCSC Part URL; ComponentLink3URL: https://lcsc.com/product-detail/Inductors-SMD_Chilisin-Elec-Chilisin-Elec-CLH1005T-2N7S-S-NP_C142235.html
footprint IND-0402 (0402 (1005M) Inductor)
pins: 1, 2

## CLH1005T-3N0S-S
designator L?  Inductance: 3nH
Inductor, 3nH, 150mΩ, 400mA, SMD 0402; Manufacturer: Chilisin Elec; Manufacturer Part Number: CLH1005T-3N0S-S; Self-Resonant Frequency: 6.3GHz; Q Factor: 8@100MHz; Package Size: 0402; JLCPCB Basic Part: No; JLCPCB Part Number: C142230; Supplier 1: LCSC; Category: Inductors; Supplier Part Number 1: C142230; Rated Current: 400mA; DC Resistance: 150mΩ; RoHS: Yes; ComponentLink1Description: Datasheet; ComponentLink1URL: https://wmsc.lcsc.com/wmsc/upload/file/pdf/v2/lcsc/2304140030_Chilisin-Elec-CLH1005T-3N0S-S_C142230.pdf; ComponentLink2Description: JLCPCB Part URL; ComponentLink2URL: https://jlcpcb.com/partdetail/C142230; ComponentLink3Description: LCSC Part URL; ComponentLink3URL: https://lcsc.com/product-detail/Inductors-SMD_Chilisin-Elec-Chilisin-Elec-CLH1005T-3N0S-S_C142230.html
footprint IND-0402 (0402 (1005M) Inductor)
pins: 1, 2

## CLH1005T-3N0S-S-NP
designator L?  Inductance: 3nH
Inductor, 3nH, 150mΩ, 400mA, SMD 0402; Manufacturer: Chilisin Elec; Manufacturer Part Number: CLH1005T-3N0S-S-NP; Self-Resonant Frequency: 6.3GHz; Q Factor: 8@100MHz; Package Size: 0402; JLCPCB Basic Part: No; JLCPCB Part Number: C142229; Supplier 1: LCSC; Category: Inductors; Supplier Part Number 1: C142229; Rated Current: 400mA; DC Resistance: 150mΩ; RoHS: Yes; ComponentLink1Description: Datasheet; ComponentLink1URL: https://wmsc.lcsc.com/wmsc/upload/file/pdf/v2/lcsc/2304140030_Chilisin-Elec-CLH1005T-3N0S-S-NP_C142229.pdf; ComponentLink2Description: JLCPCB Part URL; ComponentLink2URL: https://jlcpcb.com/partdetail/C142229; ComponentLink3Description: LCSC Part URL; ComponentLink3URL: https://lcsc.com/product-detail/Inductors-SMD_Chilisin-Elec-Chilisin-Elec-CLH1005T-3N0S-S-NP_C142229.html
footprint IND-0402 (0402 (1005M) Inductor)
pins: 1, 2

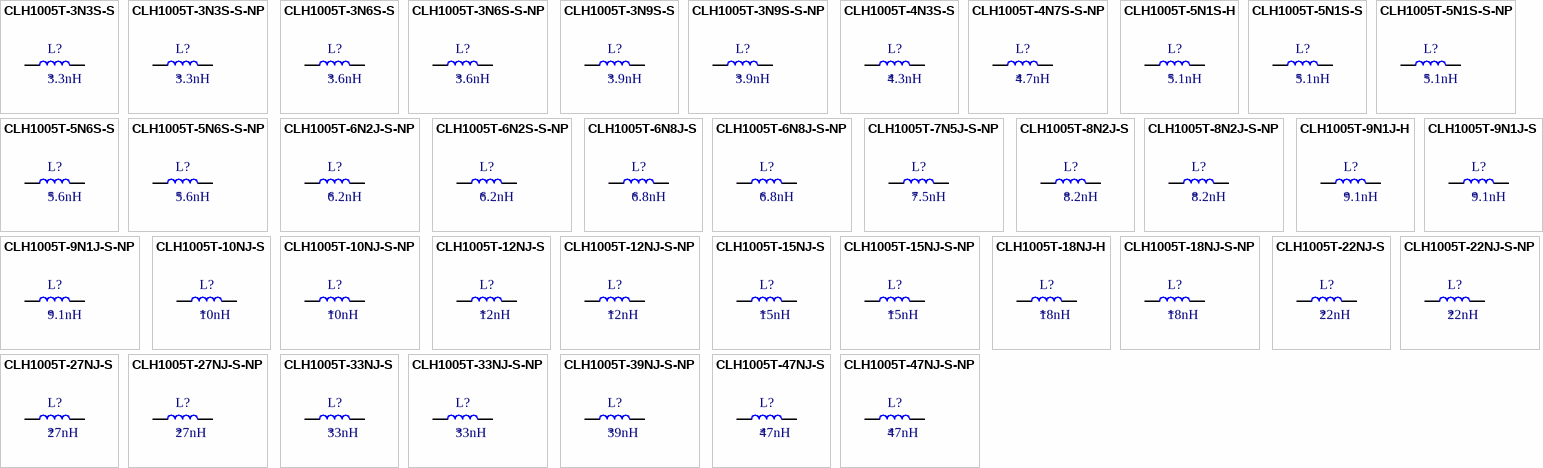
[diagram p1: symbols CLH1005T-3N3S-S to CLH1005T-47NJ-S-NP]

## CLH1005T-3N3S-S
designator L?  Inductance: 3.3nH
Inductor, 3.3nH, 150mΩ, 400mA, SMD 0402; Manufacturer: Chilisin Elec; Manufacturer Part Number: CLH1005T-3N3S-S; Self-Resonant Frequency: 6.3GHz; Q Factor: 8@100MHz; Package Size: 0402; JLCPCB Basic Part: No; JLCPCB Part Number: C108256; Supplier 1: LCSC; Category: Inductors; Supplier Part Number 1: C108256; Rated Current: 400mA; DC Resistance: 150mΩ; RoHS: Yes; ComponentLink1Description: Datasheet; ComponentLink1URL: https://wmsc.lcsc.com/wmsc/upload/file/pdf/v2/lcsc/2304140030_Chilisin-Elec-CLH1005T-3N3S-S_C108256.pdf; ComponentLink2Description: JLCPCB Part URL; ComponentLink2URL: https://jlcpcb.com/partdetail/C108256; ComponentLink3Description: LCSC Part URL; ComponentLink3URL: https://lcsc.com/product-detail/Inductors-SMD_Chilisin-Elec-Chilisin-Elec-CLH1005T-3N3S-S_C108256.html
footprint IND-0402 (0402 (1005M) Inductor)
pins: 1, 2

## CLH1005T-3N3S-S-NP
designator L?  Inductance: 3.3nH
Inductor, 3.3nH, 150mΩ, 400mA, SMD 0402; Manufacturer: Chilisin Elec; Manufacturer Part Number: CLH1005T-3N3S-S-NP; Self-Resonant Frequency: 6.3GHz; Q Factor: 8@100MHz; Package Size: 0402; JLCPCB Basic Part: No; JLCPCB Part Number: C142228; Supplier 1: LCSC; Category: Inductors; Supplier Part Number 1: C142228; Rated Current: 400mA; DC Resistance: 150mΩ; RoHS: Yes; ComponentLink1Description: Datasheet; ComponentLink1URL: https://wmsc.lcsc.com/wmsc/upload/file/pdf/v2/lcsc/2304140030_Chilisin-Elec-CLH1005T-3N3S-S-NP_C142228.pdf; ComponentLink2Description: JLCPCB Part URL; ComponentLink2URL: https://jlcpcb.com/partdetail/C142228; ComponentLink3Description: LCSC Part URL; ComponentLink3URL: https://lcsc.com/product-detail/Inductors-SMD_Chilisin-Elec-Chilisin-Elec-CLH1005T-3N3S-S-NP_C142228.html
footprint IND-0402 (0402 (1005M) Inductor)
pins: 1, 2

## CLH1005T-3N6S-S
designator L?  Inductance: 3.6nH
Inductor, 3.6nH, 150mΩ, 400mA, SMD 0402; Manufacturer: Chilisin Elec; Manufacturer Part Number: CLH1005T-3N6S-S; Self-Resonant Frequency: 6.1GHz; Q Factor: 8@100MHz; Package Size: 0402; JLCPCB Basic Part: No; JLCPCB Part Number: C142227; Supplier 1: LCSC; Category: Inductors; Supplier Part Number 1: C142227; Rated Current: 400mA; DC Resistance: 150mΩ; RoHS: Yes; ComponentLink1Description: Datasheet; ComponentLink1URL: https://wmsc.lcsc.com/wmsc/upload/file/pdf/v2/lcsc/2304140030_Chilisin-Elec-CLH1005T-3N6S-S_C142227.pdf; ComponentLink2Description: JLCPCB Part URL; ComponentLink2URL: https://jlcpcb.com/partdetail/C142227; ComponentLink3Description: LCSC Part URL; ComponentLink3URL: https://lcsc.com/product-detail/Inductors-SMD_Chilisin-Elec-Chilisin-Elec-CLH1005T-3N6S-S_C142227.html
footprint IND-0402 (0402 (1005M) Inductor)
pins: 1, 2

## CLH1005T-3N6S-S-NP
designator L?  Inductance: 3.6nH
Inductor, 3.6nH, 150mΩ, 400mA, SMD 0402; Manufacturer: Chilisin Elec; Manufacturer Part Number: CLH1005T-3N6S-S-NP; Self-Resonant Frequency: 6.1GHz; Q Factor: 8@100MHz; Package Size: 0402; JLCPCB Basic Part: No; JLCPCB Part Number: C142226; Supplier 1: LCSC; Category: Inductors; Supplier Part Number 1: C142226; Rated Current: 400mA; DC Resistance: 150mΩ; RoHS: Yes; ComponentLink1Description: Datasheet; ComponentLink1URL: https://wmsc.lcsc.com/wmsc/upload/file/pdf/v2/lcsc/2304140030_Chilisin-Elec-CLH1005T-3N6S-S-NP_C142226.pdf; ComponentLink2Description: JLCPCB Part URL; ComponentLink2URL: https://jlcpcb.com/partdetail/C142226; ComponentLink3Description: LCSC Part URL; ComponentLink3URL: https://lcsc.com/product-detail/Inductors-SMD_Chilisin-Elec-Chilisin-Elec-CLH1005T-3N6S-S-NP_C142226.html
footprint IND-0402 (0402 (1005M) Inductor)
pins: 1, 2
